# Altium integrated library TeCrea-Misc.IntLib: 96 symbols (part 1 of 2) (continued)
## FSUSB42UMX (continued)
USB MULTIMEDIA SWITCHES; Manufacturer: ON Semiconductor / Fairchild; Number of Inputs: 2; Number of Channels: 1; Min Supply Voltage: 3V; Max Supply Voltage: 4.3V; Data Rate: 480Mbps; Output Current: 100mA; Propagation Delay: 0.25ns; Bandwidth: 720MHz; Nominal Supply Current: 1uA; Turn-Off Delay Time: 25ns; On-State Resistance: 6.5R; Turn-On Delay Time: 30ns; Throw Configuration: DPDT; Supply Type: Single; Supplier 1: Digi-Key; Manufacturer Part Number: FSUSB42UMX; Stock 1: 11386; Pricing 1: 1 = 0,59000, 10 = 0,50200, 100 = 0,37490, 500 = 0,29458, 1000 = 0,22763 (USD); RoHS: Yes; Mount: Surface Mount; Number of Pins: 10; Weight: 18.08g; Min Operating Temperature: -40°C; Max Operating Temperature: 85°C; Number of Outputs: 2; Packaging: Tape and Reel; Operating Supply Voltage: 4.3V; Package Quantity: 1; Number of Ports: 2; Termination: SMD/SMT; Length: 1.4mm; Height: 0.5mm; Width: 1.8mm; Radiation Hardening: No; REACH SVHC: No SVHC; Lead Free: Lead Free; ComponentLink1URL: http://www.farnell.com/datasheets/1815547.pdf?src-supplier=Element14; ComponentLink1Description: http://www.farnell.com/datasheets/1815547.pdf?src-supplier=Element14; ComponentLink2URL: https://www.verical.com/server-webapp/html/getDatasheet?partID=189033&src-supplier=Verical; ComponentLink2Description: https://www.verical.com/server-webapp/html/getDatasheet?partID=189033&src-supplier=Verical; ComponentLink3URL: https://www.fairchildsemi.com/datasheets/FS/FSUSB42.pdf?src-supplier=Avnet+Europe; ComponentLink3Description: https://www.fairchildsemi.com/datasheets/FS/FSUSB42.pdf?src-supplier=Avnet+Europe; ComponentLink4URL: http://www.farnell.com/datasheets/2298664.pdf?src-supplier=Farnell; ComponentLink4Description: http://www.farnell.com/datasheets/2298664.pdf?src-supplier=Farnell; ComponentLink5URL: https://www.fairchildsemi.com/datasheets/FS/FSUSB42.pdf?src-supplier=Avnet; ComponentLink5Description: https://www.fairchildsemi.com/datasheets/FS/FSUSB42.pdf?src-supplier=Avnet; ComponentLink6URL: https://www.fairchildsemi.com/datasheets/FS/FSUSB42.pdf?src-supplier=Digi-Key; ComponentLink6Description: https://www.fairchildsemi.com/datasheets/FS/FSUSB42.pdf?src-supplier=Digi-Key; Value: FSUSB42UMX; Supplier Part Number 1: FSUSB42UMXCT-ND
footprint FSUSB42UMX
pins: 1 D+, 2 D-, 3 GND, 4 HSD1-, 5 HSD1+, 6 HSD2-, 7 HSD2+, 8 ~{OE}, 9 VCC, 10 SEL

## FXMA2102L8X
designator U?  Supplier Part Number 2: NC7SB3157P6XCT-ND
TRANSLATOR/BUFF/REPEAT 8-MLP; Manufacturer: Fairchild/ON Semiconductor; Translator Type: Voltage Level; Channel Type: Bidirectional; Number of Circuits: 1; Channels per Circuit: 2; Voltage - VCCA: 1.65 V ~ 5.5 V; Output Type: Open Drain, Tri-State; Data Rate: 37MHz; Supplier 1: Digi-Key; Manufacturer Part Number: FXMA2102L8X; RoHS: RoHS Compliant; Category: Integrated Circuits (ICs); Stock 1: 26744; Pricing 1: 1=0.62, 10=0.544, 100=0.4169, 500=0.3296, 1000=0.26368 (USD); Packaging: Cut Tape (CT); Part Status: Active; Voltage - VCCB: 1.65 V ~ 5.5 V; Input Signal: -; Output Signal: -; Operating Temperature: -40°C ~ 85°C (TA); Features: -; Mounting Type: Surface Mount; Package / Case: 8-UFQFN; Supplier Device Package: 8-MicroPak™; ComponentLink1URL: https://www.fairchildsemi.com/datasheets/FX/FXMA2102.pdf; ComponentLink1Description: https://www.fairchildsemi.com/datasheets/FX/FXMA2102.pdf; Value: FXMA2102L8X; Supplier Part Number 1: FXMA2102L8XCT-ND; Supplier 2: Digi-Key
footprint MicroPak 8L
pins: 1 VCCA, 2 A0, 3 A1, 4 GND, 5 ~{OE}, 6 B1, 7 B0, 8 VCCB

## HS300 10R F
designator RPOT?, comment 10R/300W
RES CHAS MNT 10 OHM 1% 300W; Manufacturer: Ohmite; Manufacturer Part Number: HS300 10R F; Resistance (Ohms): 10; Temperature Coefficient: ±100ppm/°C; Coating, Housing Type: Aluminum; Populated: Yes; Supplier 1: Digi-Key; Supplier Part Number 1: HS300 10R F-ND; RoHS: RoHS Compliant; Category: Resistors; Stock 1: 28; Pricing 1: 1=35.8, 10=31.482, 50=27.2258, 100=26.748 (USD); Packaging: Bulk; Tolerance: ±1%; Power (Watts): 300W; Composition: Wirewound; Operating Temperature: -; Features: -; Mounting Feature: Flanges; Size / Dimension: 5.027" L x 1.791" W (127.70mm x 45.50mm); Height: 1.646" (41.80mm); Lead Style: M6 Threaded; Package / Case: Axial, Box; ComponentLink1URL: http://www.ohmite.com/cat/acl_hs1.pdf; ComponentLink1Description: http://www.ohmite.com/cat/acl_hs1.pdf; Value: 10R/300W
footprint HS300
pins: 1, 2

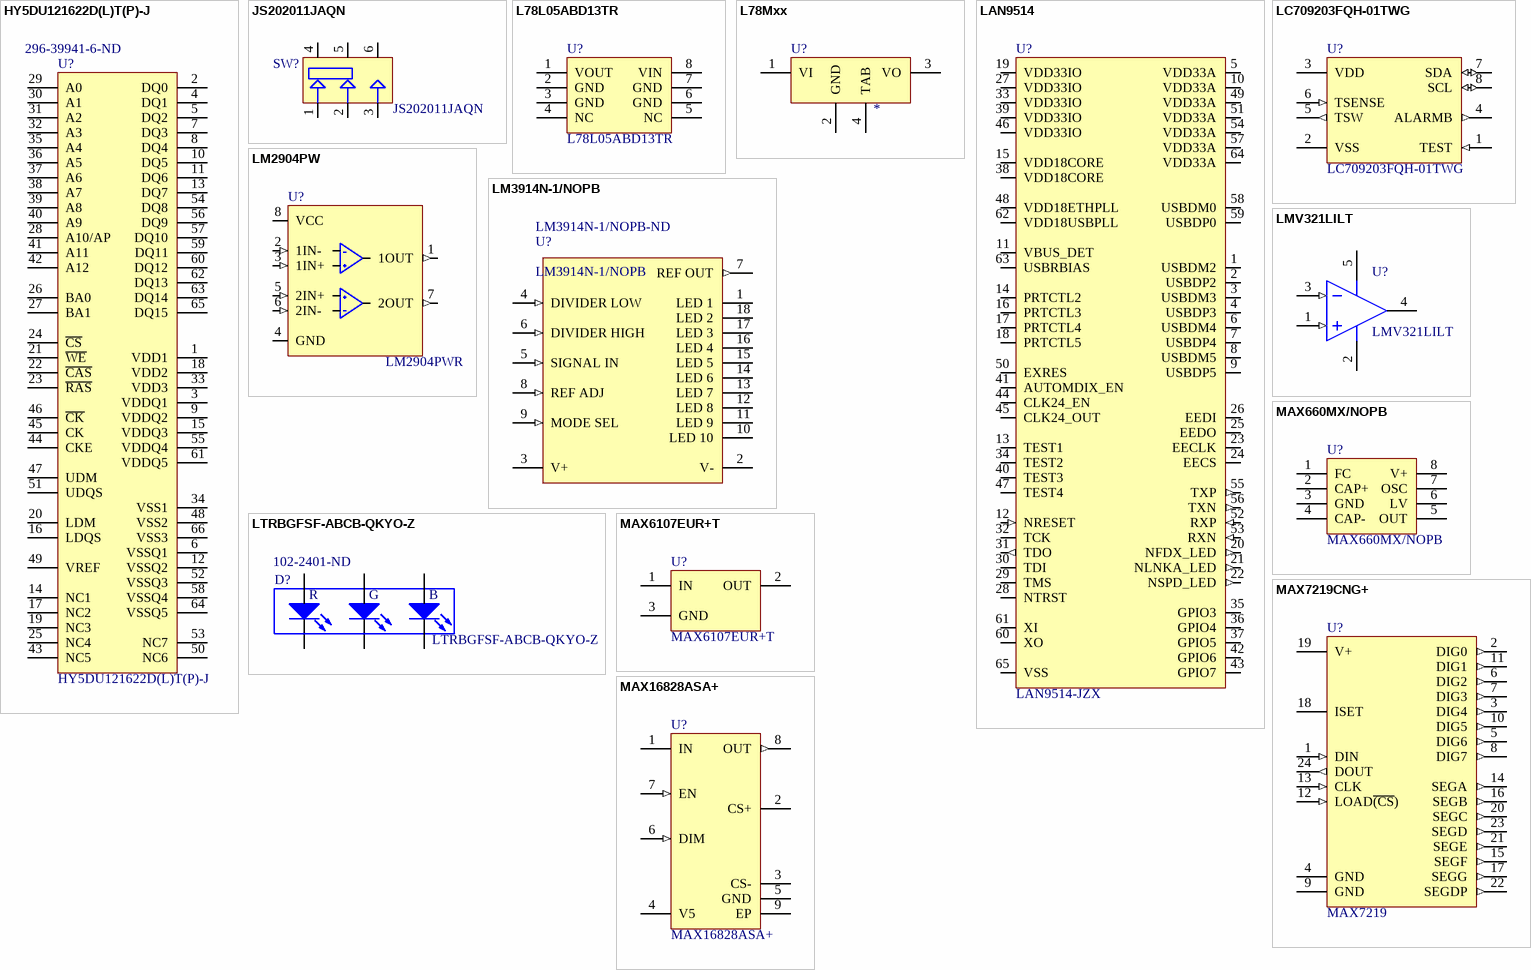
[diagram p1: symbols HY5DU121622D(L)T(P)-J to MAX16828ASA+]

## HY5DU121622D(L)T(P)-J
designator U?  Supplier Part Number 1: 296-39941-6-ND
512Mb DDR SDRAM; Populated: Yes; Value: HY5DU121622D(L)T(P)-J; ClassName: *; ROHS: Yes; Supplier 1: Digi-Key
footprint 66TSOP-II
pins: 1 VDD1 (power), 2 DQ0, 3 VDDQ1 (power), 4 DQ1, 5 DQ2, 6 VSSQ1 (power), 7 DQ3, 8 DQ4, 9 VDDQ2 (power), 10 DQ5, 11 DQ6, 12 VSSQ2 (power), 13 DQ7, 14 NC1, 15 VDDQ3 (power), 16 LDQS, 17 NC2, 18 VDD2 (power), 19 NC3, 20 LDM, 21 ~{WE}, 22 ~{CAS}, 23 ~{RAS}, 24 ~{CS}, 25 NC4, 26 BA0, 27 BA1, 28 A10/AP, 29 A0, 30 A1, 31 A2, 32 A3, 33 VDD3 (power), 34 VSS1 (power), 35 A4, 36 A5, 37 A6, 38 A7, 39 A8, 40 A9, 41 A11, 42 A12, 43 NC5, 44 CKE, 45 CK, 46 ~{CK}, 47 UDM, 48 VSS2 (power), 49 VREF, 50 NC6, 51 UDQS, 52 VSSQ3 (power), 53 NC7, 54 DQ8, 55 VDDQ4 (power), 56 DQ9, 57 DQ10, 58 VSSQ4 (power), 59 DQ11, 60 DQ12, 61 VDDQ5 (power), 62 DQ13, 63 DQ14, 64 VSSQ5 (power), 65 DQ15, 66 VSS3 (power)

## JS202011JAQN
designator SW?
SWITCH SLIDE DPDT 300MA 6V; Manufacturer: ITT C&K; Supplier 1: Digi-Key; Manufacturer Part Number: JS202011JAQN; Stock 1: 21659; Pricing 1: 1 = 0,51000, 10 = 0,48800, 25 = 0,47760, 50 = 0,42680, 100 = 0,40660, 250 = 0,39640, 500 = 0,33542 (USD); Value: JS202011JAQN; Supplier Part Number 1: CKN10722CT-ND
footprint JS202011JAQN
pins: 1, 2, 3, 4, 5, 6

## L78L05ABD13TR
designator U?
Standard Regulator Pos 5V 0.1A 8-Pin SO N T/R; Manufacturer: STMicroelectronics; Output Type: Fixed; Dropout Voltage: 1.7V; Number of Outputs: 1; Output Current: 100mA; Max Input Voltage: 30V; Min Input Voltage: 7V; Polarity: Positive; Quiescent Current: 6mA; Power Supply Rejection Ratio (PSRR): 49dB; Supplier 1: Digi-Key; Manufacturer Part Number: L78L05ABD13TR; RoHS: Yes; Category: Voltage Regulators - Linear; Stock 1: 14988; Pricing 1: 1=0,48000, 10=0,36100, 25=0,32520, 100=0,17730, 250=0,17140, 500=0,15366, 1000=0,11820 (USD); Mount: Surface Mount; Case/Package: SO; Number of Pins: 8; Weight: 0.01lb; Min Operating Temperature: -40°C; Max Operating Temperature: 125°C; Packaging: Tape and Reel; Package Quantity: 1; Max Output Current: 100mA; Output Voltage: 5V; Nominal Output Voltage: 5V; Number of Regulators: 1; Max Output Voltage: 5V; Min Output Voltage: 5V; Length: 5mm; Height: 1.25mm; Width: 4mm; Radiation Hardening: No; Lead Free: Lead Free; REACH SVHC: No SVHC; ComponentLink1URL: https://datasheet.ciiva.com/15111/getdatasheetpartid-90496-15111599.pdf?src-supplier=Verical; ComponentLink1Description: https://datasheet.ciiva.com/15111/getdatasheetpartid-90496-15111599.pdf?src-supplier=Verical; ComponentLink2URL: https://datasheet.ciiva.com/34303/2018984-34303887.pdf?src-supplier=Jameco; ComponentLink2Description: https://datasheet.ciiva.com/34303/2018984-34303887.pdf?src-supplier=Jameco; ComponentLink3URL: https://datasheet.ciiva.com/1512/1868798-1512339.pdf?src-supplier=Element14; ComponentLink3Description: https://datasheet.ciiva.com/1512/1868798-1512339.pdf?src-supplier=Element14; ComponentLink4URL: https://datasheet.ciiva.com/2041/cd00000446-2041814.pdf?src-supplier=Digi-Key; ComponentLink4Description: https://datasheet.ciiva.com/2041/cd00000446-2041814.pdf?src-supplier=Digi-Key; ComponentLink5URL: https://datasheet.ciiva.com/16391/cd00000446-16391590.pdf?src-supplier=Future+Electronics; ComponentLink5Description: https://datasheet.ciiva.com/16391/cd00000446-16391590.pdf?src-supplier=Future+Electronics; ComponentLink6URL: https://datasheet.ciiva.com/4882/cd00000446-4882057.pdf?src-supplier=Mouser; ComponentLink6Description: https://datasheet.ciiva.com/4882/cd00000446-4882057.pdf?src-supplier=Mouser; ComponentLink7URL: https://datasheet.ciiva.com/28652/1868798-28652459.pdf?src-supplier=Element14; ComponentLink7Description: https://datasheet.ciiva.com/28652/1868798-28652459.pdf?src-supplier=Element14; ComponentLink8URL: https://datasheet.ciiva.com/2041/cd00000446-2041813.pdf?src-supplier=Digi-Key; ComponentLink8Description: https://datasheet.ciiva.com/2041/cd00000446-2041813.pdf?src-supplier=Digi-Key; ComponentLink9URL: https://datasheet.ciiva.com/2041/cd00000446-2041815.pdf?src-supplier=Digi-Key; ComponentLink9Description: https://datasheet.ciiva.com/2041/cd00000446-2041815.pdf?src-supplier=Digi-Key; ComponentLink10URL: https://datasheet.ciiva.com/46385/1868798-46385453.pdf?src-supplier=Element14; ComponentLink10Description: https://datasheet.ciiva.com/46385/1868798-46385453.pdf?src-supplier=Element14; Value: L78L05ABD13TR; Supplier Part Number 1: 497-1180-1-ND
footprint SOIC8 (SOIC, 8-Leads, Body 4.9x3.9mm, Pitch 1.27mm, IPC Medium Density)
pins: 1 VOUT, 2 GND, 3 GND, 4 NC, 5 NC, 6 GND, 7 GND, 8 VIN

## L78Mxx
designator U?
IC REG LINEAR; Value: *
footprint DPAK
pins: 1 VI, 2 GND, 3 VO, 4 TAB

## LAN9514
designator U?, comment LAN9514-JZX
IC USB 2.0 Ethernet Controller 64QFN(9x9); Manuf1: Microchip Technology; Populated: Yes; Value: LAN9514-JZX; Manuf1Partnumber: LAN9514-JZX; PackageReference: QFN64(9X9); ROHS: Yes; Supplier 1: Digi-Key; Supplier Part Number 1: 638-1087-ND
footprint QFN64-L
pins: 1 USBDM2 (io), 2 USBDP2 (io), 3 USBDM3 (io), 4 USBDP3 (io), 5 VDD33A (power), 6 USBDM4 (io), 7 USBDP4 (io), 8 USBDM5 (io), 9 USBDP5 (io), 10 VDD33A (power), 11 VBUS_DET, 12 NRESET (in), 13 TEST1, 14 PRTCTL2, 15 VDD18CORE (power), 16 PRTCTL3, 17 PRTCTL4, 18 PRTCTL5, 19 VDD33IO (power), 20 NFDX_LED (out), 21 NLNKA_LED (out), 22 NSPD_LED (out), 23 EECLK (hiz), 24 EECS (hiz), 25 EEDO (hiz), 26 EEDI, 27 VDD33IO (power), 28 NTRST, 29 TMS, 30 TDI, 31 TDO (out), 32 TCK, 33 VDD33IO (power), 34 TEST2, 35 GPIO3 (io), 36 GPIO4 (io), 37 GPIO5 (io), 38 VDD18CORE (power), 39 VDD33IO (power), 40 TEST3, 41 AUTOMDIX_EN, 42 GPIO6 (io), 43 GPIO7 (io), 44 CLK24_EN, 45 CLK24_OUT (hiz), 46 VDD33IO (power), 47 TEST4, 48 VDD18ETHPLL, 49 VDD33A (power), 50 EXRES, 51 VDD33A (power), 52 RXP (in), 53 RXN (in), 54 VDD33A (power), 55 TXP (out), 56 TXN (out), 57 VDD33A (power), 58 USBDM0 (io), 59 USBDP0 (io), 60 XO, 61 XI, 62 VDD18USBPLL (power), 63 USBRBIAS, 64 VDD33A (power), 65 VSS

## LC709203FQH-01TWG
designator U?
IC BATT MONITOR LI-ION 8WDFN; Manufacturer 1: ON Semiconductor; Operating Supply Voltage: 4.5V; Number of Cells: 1; Interface: I2C; Supplier 1: Digi-Key; Manufacturer Part Number 1: LC709203FQH-01TWG; Stock 1: 17368; Pricing 1: 1=1,63000, 10=1,46000, 25=1,38600, 100=1,06430, 250=0,94052, 500=0,89100, 1000=0,69300 (USD); RoHS: Yes; Mount: Surface Mount; Number of Pins: 8; Contact Plating: Tin; Min Operating Temperature: -40°C; Max Operating Temperature: 85°C; Package Quantity: 2000; Packaging: Tape and Reel; Radiation Hardening: No; Lead Free: Lead Free; ComponentLink1URL: http://www.mouser.com/ds/2/308/ENA2237-D-321387.pdf?src-supplier=Mouser; ComponentLink1Description: http://www.mouser.com/ds/2/308/ENA2237-D-321387.pdf?src-supplier=Mouser; ComponentLink2URL: http://www.farnell.com/datasheets/2236954.pdf?src-supplier=Farnell; ComponentLink2Description: http://www.farnell.com/datasheets/2236954.pdf?src-supplier=Farnell; ComponentLink3URL: http://www.onsemi.com/pub/Collateral/ENA2237-D.PDF?src-supplier=Avnet; ComponentLink3Description: http://www.onsemi.com/pub/Collateral/ENA2237-D.PDF?src-supplier=Avnet; ComponentLink4URL: http://www.onsemi.com/pub/Collateral/LC709203F-D.PDF?src-supplier=Digi-Key; ComponentLink4Description: http://www.onsemi.com/pub/Collateral/LC709203F-D.PDF?src-supplier=Digi-Key; ComponentLink5URL: http://www.farnell.com/datasheets/2236954.pdf?src-supplier=Newark; ComponentLink5Description: http://www.farnell.com/datasheets/2236954.pdf?src-supplier=Newark; ComponentLink6URL: http://www.onsemi.com/pub/Collateral/ENA2237-D.PDF?src-supplier=Avnet+Asia; ComponentLink6Description: http://www.onsemi.com/pub/Collateral/ENA2237-D.PDF?src-supplier=Avnet+Asia; Value: LC709203FQH-01TWG; Supplier Part Number 1: LC709203FQH-01TWGOSCT-ND
footprint WDFN8 3X4 (SON, 8-Leads, Body 3,00x4,00mm, Pitch 0,65mm, Thermal Pad 1,80x2,40mm, IPC Medium Density)
pins: 1 TEST (in), 2 VSS, 3 VDD, 4 ALARMB (out), 5 TSW (out), 6 TSENSE (in), 7 SDA (io), 8 SCL (io)

## LM2904PW
designator U?, comment LM2904PWR
IC OPAMP GP 700KHZ 8TSSOP; Manuf1: Texas Instruments; Populated: Yes; Manuf1Partnumber: LM2904PWR; PackageReference: TSSOP-8; Value: LM2904PWR; ROHS: Yes; Supplier 1: Digi-Key; Supplier Part Number 1: 296-9529-1-ND
footprint SOP65P640X120-8N
pins: 1 1OUT (out), 2 1IN- (in), 3 1IN+ (in), 4 GND, 5 2IN+ (in), 6 2IN- (in), 7 2OUT (out), 8 VCC (power)

## LM3914N-1/NOPB
designator U?  Supplier Part Number 1: LM3914N-1/NOPB-ND
TEXAS INSTRUMENTS - LM3914N-1/NOPB - IC, DOT/BAR DISPLAY DRIVER, PDIP-18; Manufacturer: TI National Semiconductor; Max Supply Voltage: 25V; Output Voltage: 1.34V; Number of Segments: 10; Output Current: 30mA; Max Supply Current: 9.2mA; Max Power Dissipation: 1.365W; Min Input Voltage: 1.2V; Max Input Voltage: 12V; Display Type: LCD; Min Supply Voltage: 3V; Supplier 1: Digi-Key; Manufacturer Part Number: LM3914N-1/NOPB; RoHS: Yes; Category: LED Drivers; Mount: Through Hole; Case/Package: PDIP; Number of Pins: 18; Weight: 0.01lb; Contact Plating: Tin,Matte; Min Operating Temperature: 0°C; Max Operating Temperature: 70°C; Packaging: Rail/Tube; Package Quantity: 20; Number of Outputs: 10; Nominal Supply Current: 9.2mA; Number of Channels: 10; Power Dissipation: 1.365W; Max Output Voltage: 1.34V; Termination: Through Hole; Length: 22.86mm; Height: 3.9mm; Width: 6.35mm; Radiation Hardening: No; Lead Free: Lead Free; REACH SVHC: No SVHC; ComponentLink1URL: https://datasheet.ciiva.com/26325/176451-da-01-en-lm-3914-26325920.pdf?src-supplier=Conrad; ComponentLink1Description: https://datasheet.ciiva.com/26325/176451-da-01-en-lm-3914-26325920.pdf?src-supplier=Conrad; ComponentLink2URL: https://datasheet.ciiva.com/6613/lm3914-6613813.pdf?src-supplier=Digi-Key; ComponentLink2Description: https://datasheet.ciiva.com/6613/lm3914-6613813.pdf?src-supplier=Digi-Key; ComponentLink3URL: https://datasheet.ciiva.com/1497/1761256-1497037.pdf?src-supplier=Element14; ComponentLink3Description: https://datasheet.ciiva.com/1497/1761256-1497037.pdf?src-supplier=Element14; Value: LM3914N-1/NOPB
footprint DIP8_SMD (DIP8 SMD Mount)
pins: 1 LED 1 (oc), 2 V- (power), 3 V+ (power), 4 DIVIDER LOW (in), 5 SIGNAL IN (in), 6 DIVIDER HIGH (in), 7 REF OUT (out), 8 REF ADJ (in), 9 MODE SEL (in), 10 LED 10 (oc), 11 LED 9 (oc), 12 LED 8 (oc), 13 LED 7 (oc), 14 LED 6 (oc), 15 LED 5 (oc), 16 LED 4 (oc), 17 LED 3 (oc), 18 LED 2 (oc)

## LMV321LILT
designator U?
OP Amp Single GP R-R O/P 5.5V 5-Pin SOT-23 T/R; Manufacturer 1: STMicroelectronics; Gain Bandwidth Product: 1.3MHz; Input Offset Voltage (Vos): 1mV; Input Bias Current: 27nA; Operating Supply Current: 130uA; Number of Circuits: 1; Output Current per Channel: 70mA; Common Mode Rejection Ratio: 72dB; Output Current: 46mA; Slew Rate: 0.7V/µs; Nominal Supply Current: 220uA; Min Supply Voltage: 2.7V; Voltage Gain: 100dB; Supplier 1: Digi-Key; Manufacturer Part Number 1: LMV321LILT; RoHS: Yes; Category: Amplifiers - Op Amps, Buffer, Instrumentation; Stock 1: 63614; Pricing 1: 1=0,40000, 10=0,34200, 25=0,31960, 100=0,23740, 250=0,20088, 500=0,19174, 1000=0,14152 (USD); Mount: Surface Mount; Case/Package: SOT-23-5; Number of Pins: 5; Min Operating Temperature: -40°C; Max Operating Temperature: 125°C; Number of Elements: 1; Number of Channels: 1; Packaging: Tape and Reel; Max Supply Voltage: 5.5V; Package Quantity: 1; Unity Gain Bandwidth Product: 1.3MHz; Radiation Hardening: No; Lead Free: Lead Free; ComponentLink1URL: https://datasheet.ciiva.com/41459/001184778-da-01-en-ic-op-amp-sgl-r-lmv321lilt-sot-23-5-stm-41459588.pdf?src-supplier=Conrad; ComponentLink1Description: https://datasheet.ciiva.com/41459/001184778-da-01-en-ic-op-amp-sgl-r-lmv321lilt-sot-23-5-stm-41459588.pdf?src-supplier=Conrad; ComponentLink2URL: https://datasheet.ciiva.com/6629/dm00052423-6629959.pdf?src-supplier=Digi-Key; ComponentLink2Description: https://datasheet.ciiva.com/6629/dm00052423-6629959.pdf?src-supplier=Digi-Key; ComponentLink3URL: https://datasheet.ciiva.com/6629/dm00052423-6629960.pdf?src-supplier=Digi-Key; ComponentLink3Description: https://datasheet.ciiva.com/6629/dm00052423-6629960.pdf?src-supplier=Digi-Key; ComponentLink4URL: https://datasheet.ciiva.com/6629/dm00052423-6629961.pdf?src-supplier=Digi-Key; ComponentLink4Description: https://datasheet.ciiva.com/6629/dm00052423-6629961.pdf?src-supplier=Digi-Key; ComponentLink5URL: https://datasheet.ciiva.com/16209/dm00052423-16209067.pdf?src-supplier=Future+Electronics; ComponentLink5Description: https://datasheet.ciiva.com/16209/dm00052423-16209067.pdf?src-supplier=Future+Electronics; ComponentLink6URL: https://datasheet.ciiva.com/2966/dm00052423-2966012.pdf?src-supplier=Avnet; ComponentLink6Description: https://datasheet.ciiva.com/2966/dm00052423-2966012.pdf?src-supplier=Avnet; Value: LMV321LILT; Supplier Part Number 1: 497-13051-1-ND
footprint SOT23-5L (SOT23, 5-Leads, Body 2.90x2.80mm, Pitch 0.95mm, IPC Medium Density)
pins: 1 IN+ (in), 2 VCC- (power), 3 IN- (in), 4 OUT (hiz), 5 VCC+ (power)

## LTRBGFSF-ABCB-QKYO-Z
designator D?  Supplier Part Number 2: 102-2401-ND
LED RGB DIFFUSED 6SMD; Manufacturer: OSRAM Opto Semiconductors Inc.; Color: Red, Green, Blue (RGB); Millicandela Rating: 700mcd Red, 1350mcd Green, 160mcd Blue; Lens Style/Size: Square with Flat Top; Voltage - Forward (Vf) (Typ): 2.05V Red, 3.2V Green, 3.2V Blue; Current - Test: 20mA Red, 20mA Green, 10mA Blue; Viewing Angle: 120°; Wavelength - Dominant: 625nm Red, 530nm Green, 460mn Blue; Wavelength - Peak: 632nm Red, 523nm Green, 465nm Blue; Supplier 1: Digi-Key; Manufacturer Part Number: LTRBGFSF-ABCB-QKYO-Z; RoHS: RoHS Compliant; Category: Optoelectronics; Stock 1: 93519; Pricing 1: 1=0.81, 10=0.629, 25=0.5212, 100=0.4492, 250=0.39532, 500=0.3414 (USD); Packaging: Cut Tape (CT); Part Status: Active; Lens Color: -; Lens Transparency: Diffused; Mounting Type: Surface Mount; Features: -; Package / Case: 6-SMD, J-Lead; Supplier Device Package: 6-PLCC; Size / Dimension: 3.30mm L x 3.00mm W; Height (Max): 2.00mm; ComponentLink1URL: http://www.osram-os.com/Graphics/XPic9/00134830_0.pdf; ComponentLink1Description: http://www.osram-os.com/Graphics/XPic9/00134830_0.pdf; Value: LTRBGFSF-ABCB-QKYO-Z; Supplier Part Number 1: 475-2899-1-ND; Supplier 2: Digi-Key
footprint LRTB-GFTM
pins: A1, A2, A3, C1, C2, C3
text: R; G; B

## MAX660MX/NOPB
designator U?
IC REG SWTCHD CAP INV 0.1A 8SOIC; Manufacturer: Texas Instruments; Function: Ratiometric; Output Configuration: Positive or Negative; Topology: Charge Pump; Output Type: Fixed; Number of Outputs: 1; Voltage - Input (Min): 1.5V; Voltage - Input (Max): 5.5V; Voltage - Output (Min/Fixed): -Vin, 2Vin; Current - Output: 100mA; Frequency - Switching: 10kHz, 80kHz; Synchronous Rectifier: No; Supplier 1: Digi-Key; Manufacturer Part Number: MAX660MX/NOPB; RoHS: RoHS Compliant; Category: Integrated Circuits (ICs); Stock 1: 4989; Pricing 1: 1=1.65, 10=1.471, 100=1.1466, 500=0.94718, 1000=0.74778 (USD); Packaging: Cut Tape (CT); Part Status: Active; Voltage - Output (Max): -; Operating Temperature: -40°C ~ 85°C (TA); Mounting Type: Surface Mount; Package / Case: 8-SOIC (0.154", 3.90mm Width); Supplier Device Package: 8-SOIC; Base Part Number: MAX660; ComponentLink1URL: http://www.ti.com/lit/ds/symlink/max660.pdf; ComponentLink1Description: http://www.ti.com/lit/ds/symlink/max660.pdf; Value: MAX660MX/NOPB; Supplier Part Number 1: MAX660MX/NOPBCT-ND
footprint SOIC8 (SOIC, 8-Leads, Body 4.9x3.9mm, Pitch 1.27mm, IPC Medium Density)
pins: 1 FC, 2 CAP+, 3 GND, 4 CAP-, 5 OUT, 6 LV, 7 OSC, 8 V+

## MAX6107EUR+T
designator U?
PMIC - voltage reference Maxim Integrated MAX6107EUR+T Series Adjustable SOT 23-3; Reference Type: Series,Fixed; Max Input Voltage: 12.6V; Min Input Voltage: 4.682V; Output Voltage: 4.5V; Tolerance: 0.4%; Max Output Current: 5mA; Output Type: Fixed; Max Supply Current: 125uA; Temperature Coefficient: 75ppm/°C; Max Output Voltage: 4.518V; Supplier 1: Digi-Key; Manufacturer 1: Maxim; Manufacturer Part Number 1: MAX6107EUR+T; Stock 1: 4299; Pricing 1: 1=1,16000, 10=1,03800, 25=0,98560, 100=0,75680, 250=0,66880, 500=0,63360, 1000=0,57200 (USD); RoHS: Yes; Mount: Surface Mount; Case/Package: SOT-23-3; Number of Pins: 3; Min Operating Temperature: -40°C; Max Operating Temperature: 85°C; Packaging: Tape and Reel; Package Quantity: 1; Min Output Voltage: 4.5V; Output Current: 5mA; Operating Supply Current: 125uA; Reference Voltage: 4.5V; Length: 3.04mm; Height: 1.02mm; Width: 1.4mm; Radiation Hardening: No; Lead Free: Lead Free; REACH SVHC: Unknown; ComponentLink1URL: https://datasheet.ciiva.com/30476/0900766b811dea62-30476385.pdf?src-supplier=RSComponents; ComponentLink1Description: https://datasheet.ciiva.com/30476/0900766b811dea62-30476385.pdf?src-supplier=RSComponents; ComponentLink2URL: https://datasheet.ciiva.com/14198/max6100-max6107-14198853.pdf?src-supplier=Avnet; ComponentLink2Description: https://datasheet.ciiva.com/14198/max6100-max6107-14198853.pdf?src-supplier=Avnet; ComponentLink3URL: https://datasheet.ciiva.com/2008/max6100-max6107-2008214.pdf?src-supplier=Digi-Key; ComponentLink3Description: https://datasheet.ciiva.com/2008/max6100-max6107-2008214.pdf?src-supplier=Digi-Key; ComponentLink4URL: https://datasheet.ciiva.com/2008/max6100-max6107-2008215.pdf?src-supplier=Digi-Key; ComponentLink4Description: https://datasheet.ciiva.com/2008/max6100-max6107-2008215.pdf?src-supplier=Digi-Key; ComponentLink5URL: https://datasheet.ciiva.com/2008/max6100-max6107-2008216.pdf?src-supplier=Digi-Key; ComponentLink5Description: https://datasheet.ciiva.com/2008/max6100-max6107-2008216.pdf?src-supplier=Digi-Key; ComponentLink6URL: https://datasheet.ciiva.com/17217/max6100-max6107-17217436.pdf?src-supplier=Avnet+Europe; ComponentLink6Description: https://datasheet.ciiva.com/17217/max6100-max6107-17217436.pdf?src-supplier=Avnet+Europe; Value: MAX6107EUR+T; Supplier Part Number 1: MAX6107EUR+TCT-ND
footprint SOT-23_N (SOT23, 3-Leads, Body 2.9x1.3mm, Pitch 0.95mm, Lead Span 2.5mm, IPC Medium Density)
pins: 1 IN, 2 OUT, 3 GND

## MAX7219CNG+
designator U?, comment MAX7219
MAXIM INTEGRATED PRODUCTS         MAX7219CNG+.             Led Driver, 8 Outputs, Common Cathode, 4V-5.5V in, 10MHz switch, 4.5V/320mA out, DIP-24; Number of Segments: 64; Max Power Dissipation: 1.066W; High Level Output Current: -2mA; Max Supply Current: 330mA; Low Level Output Current: 5mA; Interface: Serial; Output Current: 320mA; Min Input Voltage: 4V; Max Input Voltage: 5.5V; Number of Outputs: 8; Output Voltage: 4.5V; Nominal Supply Current: 8mA; Supplier 1: Digi-Key; Manufacturer 1: Maxim; Manufacturer Part Number 1: MAX7219CNG+; RoHS: Yes; Category: LED Drivers; Stock 1: 618; Pricing 1: 1=8,86000, 10=8,00400, 25=7,63200, 100=6,32900, 250=5,77056, 500=5,72404 (USD); Mount: Through Hole; Case/Package: DIP; Number of Pins: 24; Min Operating Temperature: 0°C; Max Operating Temperature: 70°C; Packaging: Rail/Tube; Package Quantity: 15; Operating Supply Current: 330mA; Power Dissipation: 1.066W; Switching Frequency: 10MHz; Max Supply Voltage: 5.5V; Min Supply Voltage: 4V; Length: 32.13mm; Height: 4.45mm; Width: 7.87mm; Radiation Hardening: No; Lead Free: Lead Free; REACH SVHC: No SVHC; ComponentLink1URL: https://datasheet.ciiva.com/1604/max7219-max7221-1604016.pdf?src-supplier=Newark; ComponentLink1Description: https://datasheet.ciiva.com/1604/max7219-max7221-1604016.pdf?src-supplier=Newark; ComponentLink2URL: https://datasheet.ciiva.com/22828/0900766b8078af93-22828133.pdf?src-supplier=RSComponents; ComponentLink2Description: https://datasheet.ciiva.com/22828/0900766b8078af93-22828133.pdf?src-supplier=RSComponents; ComponentLink3URL: https://datasheet.ciiva.com/26876/max7219cng-26876053.pdf?src-supplier=IIIC; ComponentLink3Description: https://datasheet.ciiva.com/26876/max7219cng-26876053.pdf?src-supplier=IIIC; ComponentLink4URL: https://datasheet.ciiva.com/29306/170126-da-01-en-ic-max7219cng-dip24n-29306167.pdf?src-supplier=Conrad; ComponentLink4Description: https://datasheet.ciiva.com/29306/170126-da-01-en-ic-max7219cng-dip24n-29306167.pdf?src-supplier=Conrad; ComponentLink5URL: https://datasheet.ciiva.com/1497/26306-1497312.pdf?src-supplier=Element14; ComponentLink5Description: https://datasheet.ciiva.com/1497/26306-1497312.pdf?src-supplier=Element14; ComponentLink6URL: https://datasheet.ciiva.com/3163/max7219-max7221-3163771.pdf?src-supplier=Avnet; ComponentLink6Description: https://datasheet.ciiva.com/3163/max7219-max7221-3163771.pdf?src-supplier=Avnet; ComponentLink7URL: https://datasheet.ciiva.com/1940/max7219-max7221-1940622.pdf?src-supplier=Digi-Key; ComponentLink7Description: https://datasheet.ciiva.com/1940/max7219-max7221-1940622.pdf?src-supplier=Digi-Key; ComponentLink8URL: https://datasheet.ciiva.com/1497/26306-1497311.pdf?src-supplier=Element14; ComponentLink8Description: https://datasheet.ciiva.com/1497/26306-1497311.pdf?src-supplier=Element14; Value: MAX7219; Supplier Part Number 1: MAX7219CNG+-ND
footprint DIL24
pins: 1 DIN (in), 2 DIG0 (out), 3 DIG4 (out), 4 GND, 5 DIG6 (out), 6 DIG2 (out), 7 DIG3 (out), 8 DIG7 (out), 9 GND, 10 DIG5 (out), 11 DIG1 (out), 12 LOAD~{(CS}) (in), 13 CLK (in), 14 SEGA (out), 15 SEGF (out), 16 SEGB (out), 17 SEGG (out), 18 ISET, 19 V+, 20 SEGC (out), 21 SEGE (out), 22 SEGDP (out), 23 SEGD (out), 24 DOUT (out)

## MAX16828ASA+
designator U?
IC LED DRVR LIN DIM 200MA 8SOIC; Manufacturer: Maxim; Power Dissipation: 1.8605W; Output Voltage: 5V; Operating Supply Voltage: 40V; Number of Outputs: 1; Supplier 1: Digi-Key; Manufacturer Part Number: MAX16828ASA+; RoHS: Yes; Category: LED Drivers; Stock 1: 1928; Pricing 1: 1=2,83000, 10=2,54400, 25=2,40000, 100=1,92000, 250=1,68000, 500=1,63200, 1000=1,29600, 2500=1,24800, 5000=1,20000 (USD); Mount: Surface Mount; Number of Pins: 8; Min Operating Temperature: -40°C; Max Operating Temperature: 125°C; Output Current: 200mA; Packaging: Rail/Tube; Package Quantity: 100; Max Power Dissipation: 1.8605W; Radiation Hardening: No; ComponentLink1URL: https://datasheet.ciiva.com/12278/max16815-max16828-99676-12278049.pdf?src-supplier=Mouser; ComponentLink1Description: https://datasheet.ciiva.com/12278/max16815-max16828-99676-12278049.pdf?src-supplier=Mouser; ComponentLink2URL: https://datasheet.ciiva.com/1948/max16815-max16828-1948580.pdf?src-supplier=Digi-Key; ComponentLink2Description: https://datasheet.ciiva.com/1948/max16815-max16828-1948580.pdf?src-supplier=Digi-Key; ComponentLink3URL: https://datasheet.ciiva.com/3164/max16815-max16828-3164862.pdf?src-supplier=Avnet; ComponentLink3Description: https://datasheet.ciiva.com/3164/max16815-max16828-3164862.pdf?src-supplier=Avnet; Value: MAX16828ASA+; Supplier Part Number 1: MAX16828ASA+-ND
footprint SOIC S8E-12 (SOIC, 8-Leads, Body 4,89x3,90mm, Pitch 1,27mm, Thermal Pad 2,29x2,29mm, IPC Medium Density)
pins: 1 IN, 2 CS+, 3 CS-, 4 V5, 5 GND, 6 DIM (in), 7 EN (in), 8 OUT (out), 9 EP

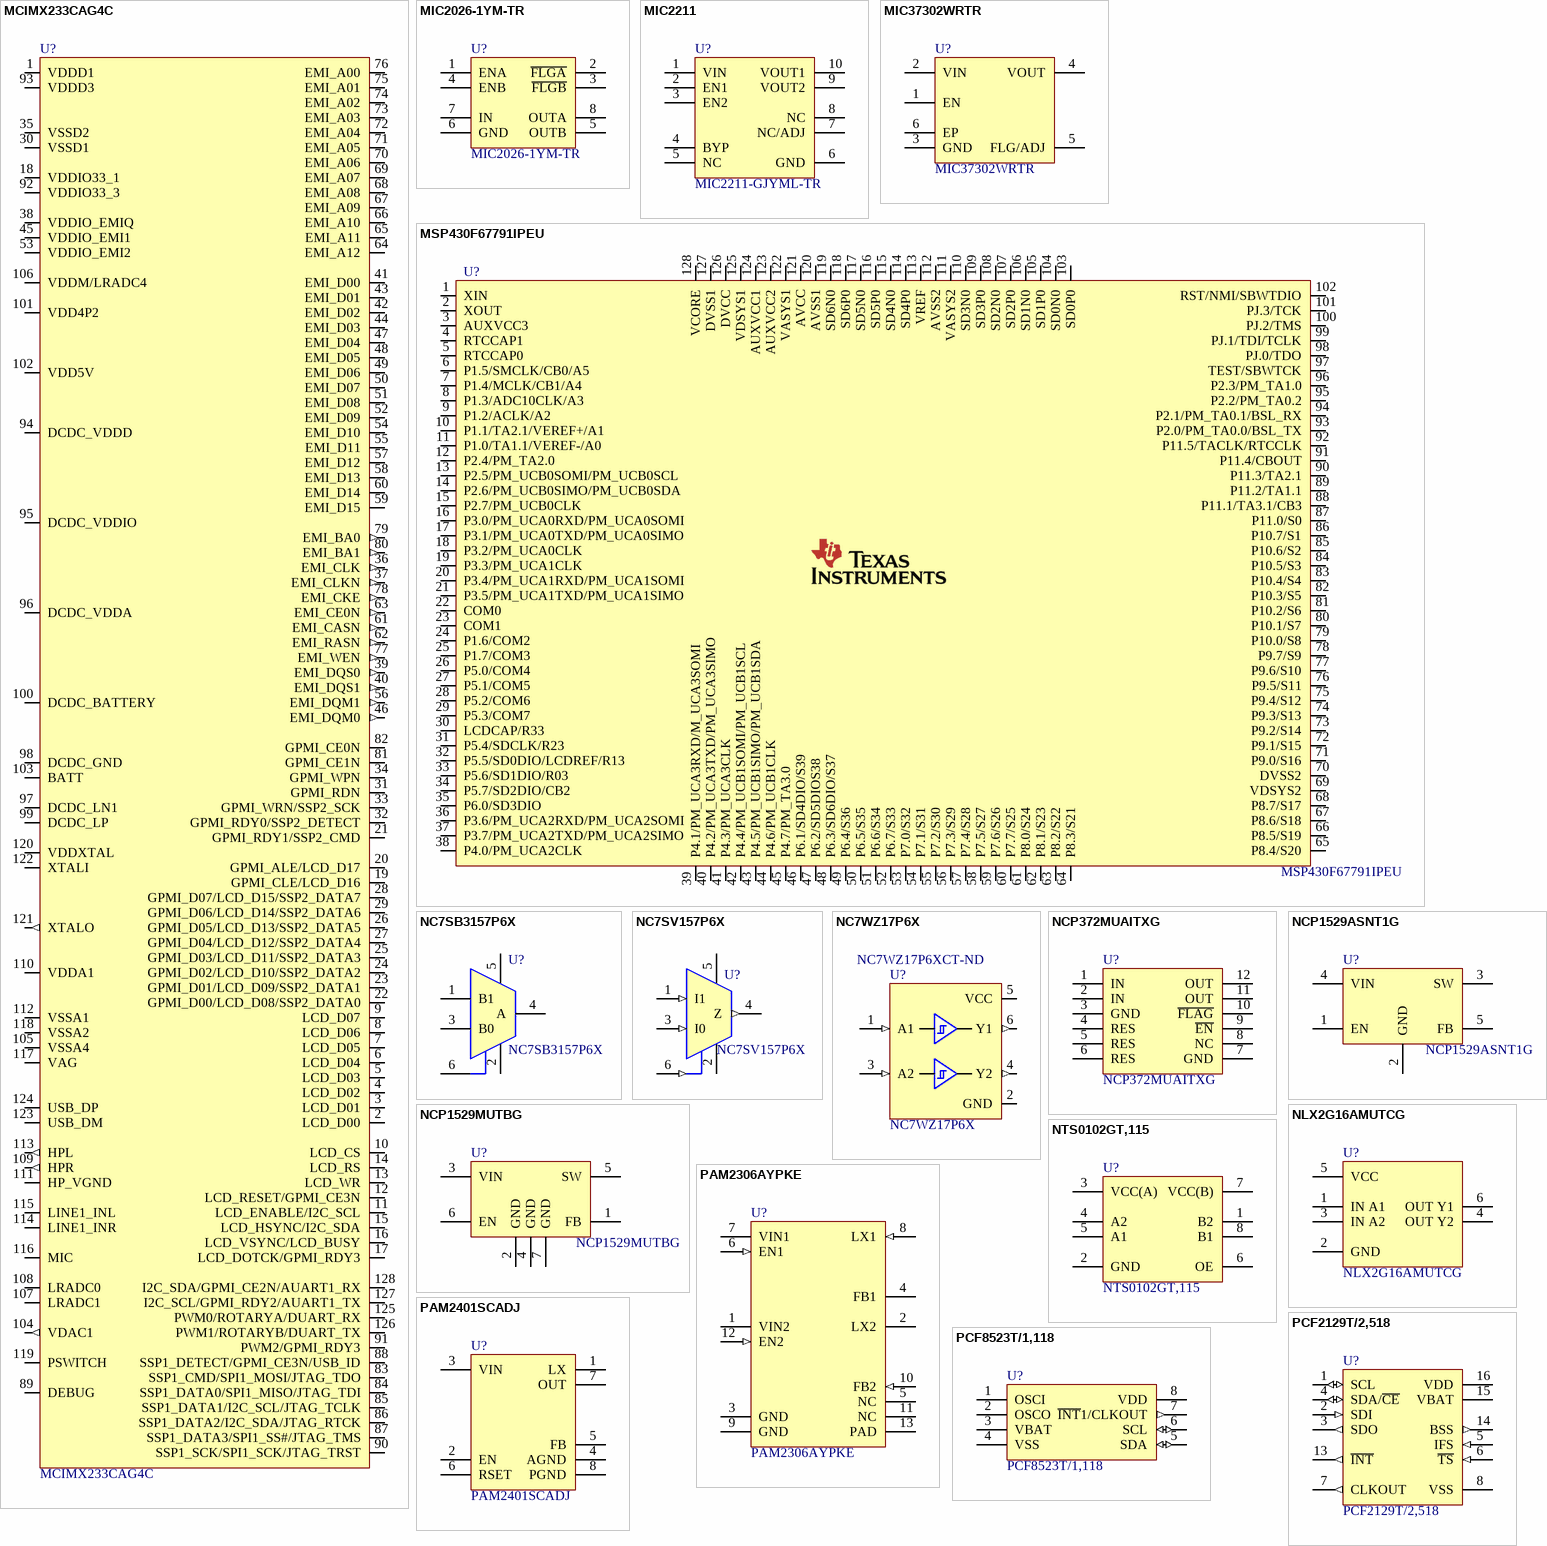
[diagram p2: symbols MCIMX233CAG4C to PCF8523T/1,118]

## MCIMX233CAG4C
designator U?
IC MPU I.MX23 454MHZ 128LQFP; Manufacturer: NXP USA Inc.; Core Processor: ARM926EJ-S; Number of Cores/Bus Width: 1 Core, 32-Bit; Co-Processors/DSP: Data; DCP; RAM Controllers: DRAM; Graphics Acceleration: No; Display & Interface Controllers: LCD, Touchscreen; USB: USB 2.0 + PHY (1); Voltage - I/O: 2.0V, 2.5V, 2.7V, 3.0V, 3.3V; Security Features: Cryptography, Hardware ID; Additional Interfaces: I²C, I²S, MMC/SD/SDIO, SAI, SPI, SSI, SSP, UART; Supplier 1: Digi-Key; Manufacturer Part Number: MCIMX233CAG4C; RoHS: RoHS Compliant; Category: Integrated Circuits (ICs); Stock 1: 1064; Pricing 1: 1=12.35, 10=11.348, 100=10.16 (USD); Packaging: Tray; Part Status: Active; Speed: 454MHz; Ethernet: -; SATA: -; Operating Temperature: -40°C ~ 85°C (TA); Package / Case: 128-LQFP; Supplier Device Package: 128-LQFP (14x14); ComponentLink1URL: http://www.nxp.com/assets/documents/data/en/reference-manuals/IMX23RM.pdf; ComponentLink1Description: http://www.nxp.com/assets/documents/data/en/reference-manuals/IMX23RM.pdf; Supplier Part Number 1: MCIMX233CAG4C-ND; Value: MCIMX233CAG4C
footprint TQFP128LD
pins: 1 VDDD1 (power), 2 LCD_D00, 3 LCD_D01, 4 LCD_D02, 5 LCD_D03, 6 LCD_D04, 7 LCD_D05, 8 LCD_D06, 9 LCD_D07, 10 LCD_CS, 11 LCD_ENABLE/I2C_SCL, 12 LCD_RESET/GPMI_CE3N, 13 LCD_WR, 14 LCD_RS, 15 LCD_HSYNC/I2C_SDA, 16 LCD_VSYNC/LCD_BUSY, 17 LCD_DOTCK/GPMI_RDY3, 18 VDDIO33_1 (power), 19 GPMI_CLE/LCD_D16, 20 GPMI_ALE/LCD_D17, 21 GPMI_RDY1/SSP2_CMD, 22 GPMI_D00/LCD_D08/SSP2_DATA0, 23 GPMI_D01/LCD_D09/SSP2_DATA1, 24 GPMI_D02/LCD_D10/SSP2_DATA2, 25 GPMI_D03/LCD_D11/SSP2_DATA3, 26 GPMI_D05/LCD_D13/SSP2_DATA5, 27 GPMI_D04/LCD_D12/SSP2_DATA4, 28 GPMI_D07/LCD_D15/SSP2_DATA7, 29 GPMI_D06/LCD_D14/SSP2_DATA6, 30 VSSD1 (power), 31 GPMI_RDN, 32 GPMI_RDY0/SSP2_DETECT, 33 GPMI_WRN/SSP2_SCK, 34 GPMI_WPN, 35 VSSD2 (power), 36 EMI_CLK (out), 37 EMI_CLKN (out), 38 VDDIO_EMIQ (power), 39 EMI_DQS0 (out), 40 EMI_DQS1 (out), 41 EMI_D00, 42 EMI_D02, 43 EMI_D01, 44 EMI_D03, 45 VDDIO_EMI1 (power), 46 EMI_DQM0 (out), 47 EMI_D04, 48 EMI_D05, 49 EMI_D06, 50 EMI_D07, 51 EMI_D08, 52 EMI_D09, 53 VDDIO_EMI2 (power), 54 EMI_D10, 55 EMI_D11, 56 EMI_DQM1 (out), 57 EMI_D12, 58 EMI_D13, 59 EMI_D15, 60 EMI_D14, 61 EMI_CASN (out), 62 EMI_RASN (out), 63 EMI_CE0N (out), 64 EMI_A12, 65 EMI_A11, 66 EMI_A10, 67 EMI_A09, 68 EMI_A08, 69 EMI_A07, 70 EMI_A06, 71 EMI_A05, 72 EMI_A04, 73 EMI_A03, 74 EMI_A02, 75 EMI_A01, 76 EMI_A00, 77 EMI_WEN (out), 78 EMI_CKE (out), 79 EMI_BA0 (out), 80 EMI_BA1 (out), 81 GPMI_CE1N, 82 GPMI_CE0N, 83 SSP1_CMD/SPI1_MOSI/JTAG_TDO, 84 SSP1_DATA0/SPI1_MISO/JTAG_TDI, 85 SSP1_DATA1/I2C_SCL/JTAG_TCLK, 86 SSP1_DATA2/I2C_SDA/JTAG_RTCK, 87 SSP1_DATA3/SPI1_SS#/JTAG_TMS, 88 SSP1_DETECT/GPMI_CE3N/USB_ID, 89 DEBUG, 90 SSP1_SCK/SPI1_SCK/JTAG_TRST, 91 PWM2/GPMI_RDY3, 92 VDDIO33_3 (power), 93 VDDD3 (power), 94 DCDC_VDDD (oe), 95 DCDC_VDDIO (oe), 96 DCDC_VDDA (oe), 97 DCDC_LN1, 98 DCDC_GND (power), 99 DCDC_LP, 100 DCDC_BATTERY (power), 101 VDD4P2 (oe), 102 VDD5V (power), 103 BATT, 104 VDAC1 (out), 105 VSSA4 (power), 106 VDDM/LRADC4 (oe), 107 LRADC1, 108 LRADC0, 109 HPR (out), 110 VDDA1 (power), 111 HP_VGND (power), 112 VSSA1 (power), 113 HPL (out), 114 LINE1_INR, 115 LINE1_INL, 116 MIC, 117 VAG, 118 VSSA2 (power), 119 PSWITCH, 120 VDDXTAL, 121 XTALO (out), 122 XTALI, 123 USB_DM, 124 USB_DP, 125 PWM0/ROTARYA/DUART_RX, 126 PWM1/ROTARYB/DUART_TX, 127 I2C_SCL/GPMI_RDY2/AUART1_TX, 128 I2C_SDA/GPMI_CE2N/AUART1_RX